# Altium schematic symbol library lib_datalogger.SchLib: 1246 symbols (part 4 of 16) (continued)
## CMP-004-000072-2 (continued)
CAP CER 3000PF 50V NP0 0805; Manufacturer Part Number: GRM2165C1H302JA01D; Temperature Coefficient: C0G, NP0; Lead Spacing: -; Thickness (Max): 0.028" (0.70mm); Package / Case: 0805 (2012 Metric); Size / Dimension: 0.079" L x 0.049" W (2.00mm x 1.25mm); Mounting Type: Surface Mount, MLCC; Lead Style: -; Voltage - Rated: 50V; Part Status: Active; Stock 1: 102721; Applications: General Purpose; Pricing 1: 1=0.25, 10=0.167, 50=0.1016, 100=0.0853, 250=0.06904, 500=0.0609, 1000=0.05177 (USD); ComponentLink1Description: http://www.murata.com/~/media/webrenewal/support/library/catalog/products/capacitor/mlcc/c02e.pdf; Features: -; Source: mits.SchLib; Category: Capacitors; Height - Seated (Max): -; ComponentLink1URL: http://www.murata.com/~/media/webrenewal/support/library/catalog/products/capacitor/mlcc/c02e.pdf; Design Item ID: CAP CER 3000PF 50V NP0 0805 SMD; Operating Temperature: -55°C ~ 125°C; Ratings: -; RoHS: RoHS Compliant
footprint CC1005-0402 (Chip Capacitor; Body 0.039" L x 0.020" W (1.00mm x 0.50mm))
footprint CC2012-0805 (Chip Capacitor)
pins: 1, 2

## CMP-004-000073-2
designator C?, comment CAP CER 4.7nF 50V C0G 0805 SMD_1  Voltage Rating: 50V  Case/Package: 0805  Packaging: Cut Tape  Tolerance: 10%  Max Operating Temperature: 90°C  Manufacturer: KEMET  Capacitance: 4.7nF  Min Operating Temperature: -55°C
Cap Ceramic 0.0047uF 50V X7R 10% Pad SMD 0805 125C Automotive T/R; Manufacturer Part Number: C0805C472K5RECAUTO; Efficiency: 83%; Max Input Voltage: 18V; Min Input Voltage: 9V; Isolation Voltage: 3kV; Number of Outputs: 1; Max Power Dissipation: 6W; Max Output Current: 500mA; Voltage - Output 1: 12V; Mount: Surface Mount; Stock 1: 7793; ComponentLink2URL: https://api.kemet.com/component-edge/download/datasheet/C0805C472K5RECAUTO.pdf?src-supplier=Digi-Key; Pricing 1: 1=0,30000, 10=0,20400, 100=0,11580, 500=0,08172, 1000=0,07151 (USD); Features: UVLO; ComponentLink2Description: https://api.kemet.com/component-edge/download/datasheet/C0805C472K5RECAUTO.pdf?src-supplier=Digi-Key; ComponentLink1Description: https://product.tdk.com/info/en/catalog/datasheets/mlcc_commercial_general_en.pdf; Ratings: AEC-Q200; Source: mits.SchLib; ComponentLink1URL: https://product.tdk.com/info/en/catalog/datasheets/mlcc_commercial_general_en.pdf; Case Code (Metric): 2012; Case Code (Imperial): 0805; Design Item ID: CAP CER 4.7nF 50V C0G 0805 SMD_1
footprint CC1005-0402 (Chip Capacitor; Body 0.039" L x 0.020" W (1.00mm x 0.50mm))
footprint CC2012-0805 (Chip Capacitor)
pins: 1, 2

## CMP-004-000074-2
designator C?, comment CAP CER 4.7uF 100V X7S 1210 SMD  Manufacturer: TDK Corporation  Packaging: Cut Tape (CT)  Capacitance: 4.7µF  Tolerance: ±20%
CAP CER 4.7UF 100V X7S 1210; Manufacturer Part Number: C3225X7S2A475M200AB; Lead Spacing: -; Operating Temperature: -55°C ~ 125°C; Thickness (Max): 0.087" (2.20mm); ComponentLink1Description: https://product.tdk.com/info/en/catalog/datasheets/mlcc_commercial_midvoltage_en.pdf; Pricing 1: 1=1.4, 10=1.148, 100=0.812, 250=0.672, 500=0.602 (USD); Stock 1: 240050; RoHS: RoHS Compliant; Design Item ID: CAP CER 4.7uF 100V X7S 1210 SMD; Ratings: -; Height - Seated (Max): -; Package / Case: 1210 (3225 Metric); Mounting Type: Surface Mount, MLCC; Lead Style: -; Size / Dimension: 0.126" L x 0.098" W (3.20mm x 2.50mm); ComponentLink1URL: https://product.tdk.com/info/en/catalog/datasheets/mlcc_commercial_midvoltage_en.pdf; Source: mits.SchLib; Applications: General Purpose; Temperature Coefficient: X7S; Features: -; Category: Capacitors; Voltage - Rated: 100V
footprint CC1005-0402 (Chip Capacitor; Body 0.039" L x 0.020" W (1.00mm x 0.50mm))
footprint CC3225-1210 (Chip Capacitor; Body 1.6 x 0.8 mm (LxW typ))
pins: 1, 2

## CMP-004-000075-2
designator C?, comment CAP CER 4.7UF 16V X7R 0805  Package Quantity: 1  Case/Package: 0805  Voltage Rating: 16V  Tolerance: 10%  RoHS Compliant: Yes  Packaging: Tape and Reel  Min Operating Temperature: -55°C  Capacitance: 4.7uF  Max Operating Temperature: 125°C
Manufacturer Part Number 1: 0805F475M160NT; Manufacturer 1: FH(Guangdong Fenghua Advanced Tech); Radiation Hardening: No; Thickness: 0.057inch; REACH SVHC: No SVHC; Case Code (Imperial): 0805; Termination: SMD/SMT; Supplier Unit Price 1: 0,0214; Case Code (Metric): 2012; Dielectric: X7R; Ratings: AEC-Q200; Depth: 1.25mm; Length: 2mm; Source: mits.SchLib; Design Item ID: CAP CER 4.7uF 16V 20% Y5V 0805 SMD; Resistor Type: Ceramic; Weight: 0.000194oz; Height: 1.25mm; Voltage Rating (DC): 16V; Width: 0.049inch; Series: CGA; Mount: Surface Mount; Lead Free: Lead Free
footprint CC1005-0402 (Chip Capacitor; Body 0.039" L x 0.020" W (1.00mm x 0.50mm))
footprint CC2012-0805 (Chip Capacitor)
pins: 1, 2

## CMP-004-000076-2
designator C?, comment CAP CER 4.7uF 50V 10% X5R 0805 SMD  Tolerance: 20%  Max Operating Temperature: 85°C  Voltage Rating: 50V  Case/Package: 0805  Capacitance: 4.7uF  Manufacturer: Murata  Packaging: Tape and Reel  Min Operating Temperature: -55°C  RoHS Compliant: Yes
CAP CER 4.7UF 50V X5R 0805; Manufacturer Part Number: GRT21BR61H475ME13L; Case Code (Metric): 2012; Category: Ceramic Capacitors; Source: mits.SchLib; RoHS: Yes; Ratings: AEC-Q200; Case Code (Imperial): 0805; ComponentLink1Description: http://search.murata.co.jp/Ceramy/image/img/A01X/G101/ENG/GRT21BR61H475ME13-01.pdf?src-supplier=Digi-Key; ComponentLink1URL: http://search.murata.co.jp/Ceramy/image/img/A01X/G101/ENG/GRT21BR61H475ME13-01.pdf?src-supplier=Digi-Key; Mount: Surface Mount; Stock 1: 430; Length: 0.079inch; Thickness: 0.057inch; Width: 0.049inch; Pricing 1: 1=0,40000, 10=0,27800, 50=0,19440, 100=0,16660, 500=0,12496, 1000=0,10552 (USD); Design Item ID: CAP CER 4.7uF 50V 10% X5R 0805 SMD
footprint CC1005-0402 (Chip Capacitor; Body 0.039" L x 0.020" W (1.00mm x 0.50mm))
footprint CC2012-0805 (Chip Capacitor)
pins: 1, 2

## CMP-004-000077-2
designator C?, comment CAP CER 4.7uF 50V 10% X7R 1206 SMD  Tolerance: ±10%  Capacitance: 4.7µF  Packaging: Cut Tape (CT)  Manufacturer: Murata Electronics North America
Manufacturer Part Number: GRM31CR71H475KA12L; eVendor#: 490-6521-1-ND; MSRP: 0,30917; eVendorPrice: 0,09; eVendor: Digi-Key; RoHS: RoHS Compliant; Design Item ID: CAP CER 4.7uF 50V 10% X7R 1206 SMD; Size / Dimension: 0.126" L x 0.063" W (3.20mm x 1.60mm); Features: -; Lead Spacing: -; Applications: General Purpose; Lead Style: -; ComponentLink1URL: http://www.murata.com/~/media/webrenewal/support/library/catalog/products/capacitor/mlcc/c02e.pdf; Height - Seated (Max): -; Stock 1: 118827; MOQ: 1000; Pricing 1: 1=0.36, 10=0.296, 50=0.1666, 100=0.148, 250=0.111, 500=0.09806, 1000=0.08695 (USD); Operating Temperature: -55°C ~ 125°C; Part#: GRM31CR71H475KA12L; Package / Case: 1206 (3216 Metric); Ratings: -; Source: mits.SchLib; Category: Capacitors; Datasheet: http://search.murata.co.jp/Ceramy/image/img/A01X/G101/ENG/GRM31CR71H475KA12-01.pdf; Thickness (Max): 0.071" (1.80mm); ComponentLink1Description: http://www.murata.com/~/media/webrenewal/support/library/catalog/products/capacitor/mlcc/c02e.pdf; Mounting Type: Surface Mount, MLCC; Temperature Coefficient: X7R; Voltage - Rated: 50V
footprint CC1005-0402 (Chip Capacitor; Body 0.039" L x 0.020" W (1.00mm x 0.50mm))
footprint CC3216-1206 (Chip Capacitor; Body 3.2 x 1.6 mm (LxW typ))
pins: 1, 2

## CMP-004-000078-2
designator C?, comment CAP CER 4.7uF 6.3V 10% X7R 0603 SMD  Voltage Rating: 6.3V  Case/Package: 0603  Packaging: Tape and Reel  Tolerance: 20%  Max Operating Temperature: 85°C  Manufacturer: Samsung Electro-Mechanics America, Inc  Package Quantity: 1  Min Operating Temperature: -55°C  RoHS Compliant: Yes  Capacitance: 4.7uF
Capacitor: ceramic; MLCC; 4.7uF; 6.3V; X5R; ±10%; SMD; 0603; -55÷85°C; Manufacturer Part Number: CL10A475KQ8NNNC; Part#: CL10B475KQ8NQNC; eVendor: LCSC; eVendorPrice: 0,0076; eVendor#: 1276-2087-1-ND; MSRP: 0,01854; Contact Plating: Tin; Length: 1.6mm; Material: Ceramic; Design Item ID: CAP CER 4.7uF 6.3V 10% X7R 0603 SMD; Height: 0.8mm; Voltage: 6.3V; Datasheet: http://www.samsungsem.com/kr/front/downloadcms.do?path=/kr/support/product-search/mlcc/__icsFiles/afieldfile/2014/11/05&fileName=S_CL10B475KQ8NQNC.pdf; MOQ: 1000; Thickness: 0.035inch; Depth: 0.8mm; Width: 0.031inch; Case Code (Metric): 1608; ComponentLink1URL: https://datasheet.ciiva.com/15195/getdatasheetpartid-358620-15195714.pdf?src-supplier=Verical; ComponentLink2Description: https://datasheet.ciiva.com/29198/457675-da-01-en-vs-kondensator-0603-29198672.pdf?src-supplier=Conrad; Construction: Flat; Pricing 1: 50=0,00760, 500=0,00550, 1500=0,00510, 5000=0,00480, 25000=0,00460, 50000=0,00460, 50=0,00730, 500=0,00530, 1500=0,00490, 5000=0,00470, 25000=0,00440, 50000=0,00440, 50=0,03790, 500=0,02750, 1500=0,02550, 5000=0,02420, 25000=0,02290, 50000=0,02290, 50=0,03660, 500=0,02650, 1500=0,02460, 5000=0,02330, 25000=0,02210, 50000=0,02210, 50=0,00490, 500=0,00360, 1500=0,00330, 5000=0,00310, 25000=0,00300, 50000=0,00300, 50=0,00420, 500=0,00300, 1500=0,00280, 5000=0,00270, 25000=0,00250, 50000=0,00250, 50=0,04510, 500=0,03260, 1500=0,03030, 5000=0,02870, 25000=0,02720, 50000=0,02720, 50=0,63580, 500=0,46040, 1500=0,42750, 5000=0,40560, 25000=0,38360, 50000=0,38360, 50=0,02400, 500=0,01740, 1500=0,01620, 5000=0,01530, 25000=0,01450, 50000=0,01450, 50=0,44090, 500=0,31930, 1500=0,29650, 5000=0,28130, 25000=0,26600, 50000=0,26600, 50=0,05010, 500=0,03630, 1500=0,03370, 5000=0,03200, 25000=0,03020, 50000=0,03020, 50=0,00780, 500=0,00570, 1500=0,00520, 5000=0,00500, 25000=0,00470, 50000=0,00470, 50=0,00580, 500=0,00420, 1500=0,00390, 5000=0,00370, 25000=0,00350, 50000=0,00350 (AUD); ComponentLink3Description: https://datasheet.ciiva.com/16437/cl05b104kq5nnnc-16437321.pdf?src-supplier=Future+Electronics; ComponentLink3URL: https://datasheet.ciiva.com/16437/cl05b104kq5nnnc-16437321.pdf?src-supplier=Future+Electronics; ComponentLink2URL: https://datasheet.ciiva.com/29198/457675-da-01-en-vs-kondensator-0603-29198672.pdf?src-supplier=Conrad; Dielectric: X5R; Radiation Hardening: No; Series: CL; Category: Ceramic Capacitors; Case Code (Imperial): 0603; Mount: Surface Mount; ComponentLink1Description: https://datasheet.ciiva.com/15195/getdatasheetpartid-358620-15195714.pdf?src-supplier=Verical; Source: mits.SchLib; Stock 1: 2545550; RoHS: Yes
footprint CC1005-0402 (Chip Capacitor; Body 0.039" L x 0.020" W (1.00mm x 0.50mm))
footprint CC1608-0603 (Chip Capacitor; Body 1.6 x 0.8 mm (LxW typ))
pins: 1, 2

## CMP-004-000079-2
designator C?, comment CAP CER 4700pF 100V X7R 0603 SMD  Packaging: Cut Tape (CT)  Tolerance: ±10%  Capacitance: 4700pF  Manufacturer: TDK Corporation
CAP CER 4700PF 100V X7R 0603; Manufacturer Part Number: CGA3E2X7R2A472K080AA; Temperature Coefficient: X7R; Package / Case: 0603 (1608 Metric); Size / Dimension: 0.063" L x 0.031" W (1.60mm x 0.80mm); Voltage - Rated: 100V; Source: mits.SchLib; Ratings: AEC-Q200; Height - Seated (Max): -; Features: -; Category: Capacitors; Lead Style: -; Design Item ID: CAP CER 4700pF 100V X7R 0603 SMD; Thickness (Max): 0.035" (0.90mm); Applications: Automotive; RoHS: RoHS Compliant; Part Status: Active; Mounting Type: Surface Mount, MLCC; Lead Spacing: -; ComponentLink1URL: https://product.tdk.com/info/en/catalog/datasheets/mlcc_automotive_midvoltage_en.pdf; ComponentLink1Description: https://product.tdk.com/info/en/catalog/datasheets/mlcc_automotive_midvoltage_en.pdf; Stock 1: 12604; Operating Temperature: -55°C ~ 125°C; Pricing 1: 1=0.1, 10=0.066, 100=0.0303, 250=0.02476, 500=0.02118, 1000=0.0165 (USD)
footprint CC1005-0402 (Chip Capacitor; Body 0.039" L x 0.020" W (1.00mm x 0.50mm))
footprint CC1608-0603 (Chip Capacitor; Body 1.6 x 0.8 mm (LxW typ))
pins: 1, 2

## CMP-004-000080-2
designator C?, comment CAP CER 4700pF 1KV X7R 3216 SMD  Capacitance: 4.7nF  Case/Package: 0805  Packaging: Tape and Reel  Package Quantity: 1  Max Operating Temperature: 125°C  Tolerance: 10%  Min Operating Temperature: -55°C  Manufacturer: Wurth Electronics  Voltage Rating: 1kV
CAP CER 4700pF 1KV  3216 SMD; Manufacturer Part Number: 885342208020; Temperature Coefficient: 30ppm/°C; Dissipation Factor: 2.5%; Dielectric Material: Ceramic; Length: 0.079inch; Height: 1.25mm; ComponentLink9Description: http://www.farnell.com/datasheets/1526458.pdf?src-supplier=Element14; ComponentLink15URL: https://datasheet.ciiva.com/153/aphvc-153206.pdf?src-supplier=Digi-Key; ComponentLink5Description: http://www.mouser.com/ds/2/212/KEM_C1034_X7R_HV_ARC_SMD-1101730.pdf?src-supplier=Mouser; ComponentLink2URL: http://uk.rs-online.com/webdocs/1528/0900766b81528e46.pdf?src-supplier=RSComponents; ComponentLink3Description: http://www.alliedelec.com/images/products/datasheets/bm/KEMET/70395618.pdf?src-supplier=Allied+Electronics; Contact Plating: Tin,Matte; ComponentLink12URL: https://datasheet.ciiva.com/11787/0900766b80ed4c37-11787782.pdf?src-supplier=RSComponents; ComponentLink7URL: http://www.farnell.com/datasheets/2740387.pdf?src-supplier=Newark; Radiation Hardening: No; Category: Ceramic Capacitors; ComponentLink7Description: http://www.farnell.com/datasheets/2740387.pdf?src-supplier=Newark; ComponentLink20URL: https://datasheet.ciiva.com/146/docfinderpartnumber-c1206c472kdractu-146779.pdf?src-supplier=Digi-Key; ComponentLink19Description: https://datasheet.ciiva.com/14594/70001075-14594431.pdf?src-supplier=Allied+Electronics; Stock 2: 6610; ComponentLink8URL: https://api.kemet.com/component-edge/download/datasheet/C0805V472KDRACTU.pdf?src-supplier=Digi-Key; Pricing 2: 1=0,34000, 10=0,23300, 50=0,16320, 100=0,13990, 500=0,10494, 1000=0,08862 (USD); ComponentLink8Description: https://api.kemet.com/component-edge/download/datasheet/C0805V472KDRACTU.pdf?src-supplier=Digi-Key; ComponentLink4Description: http://www.farnell.com/datasheets/2740387.pdf?src-supplier=Farnell; ComponentLink10URL: http://www.farnell.com/datasheets/2120589.pdf?src-supplier=Element14; ComponentLink14Description: https://datasheet.ciiva.com/153/aphvc-153205.pdf?src-supplier=Digi-Key; ComponentLink9URL: http://www.farnell.com/datasheets/1526458.pdf?src-supplier=Element14; Number of Pins: 2; ComponentLink16URL: https://datasheet.ciiva.com/7833/614334-7833527.pdf?src-supplier=Element14; ComponentLink1Description: http://www.farnell.com/datasheets/2547068.pdf?src-supplier=Farnell; Termination: SMD/SMT; ComponentLink20Description: https://datasheet.ciiva.com/146/docfinderpartnumber-c1206c472kdractu-146779.pdf?src-supplier=Digi-Key; ComponentLink5URL: http://www.mouser.com/ds/2/212/KEM_C1034_X7R_HV_ARC_SMD-1101730.pdf?src-supplier=Mouser; ComponentLink11URL: https://datasheet.ciiva.com/19476/1041285-19476096.pdf?src-supplier=Jameco; ComponentLink12Description: https://datasheet.ciiva.com/11787/0900766b80ed4c37-11787782.pdf?src-supplier=RSComponents; ComponentLink14URL: https://datasheet.ciiva.com/153/aphvc-153205.pdf?src-supplier=Digi-Key; Thickness: 0.055inch; ComponentLink18URL: https://datasheet.ciiva.com/11520/aphvc-11520843.pdf?src-supplier=Avnet; Pricing 1: 1=0,48000, 10=0,33000, 50=0,23100, 100=0,19800, 500=0,14850, 1000=0,12540 (USD); ComponentLink10Description: http://www.farnell.com/datasheets/2120589.pdf?src-supplier=Element14; Case Code (Imperial): 0805; ComponentLink1URL: http://www.farnell.com/datasheets/2547068.pdf?src-supplier=Farnell; ComponentLink13Description: https://datasheet.ciiva.com/153/aphvc-153204.pdf?src-supplier=Digi-Key; Depth: 1.25mm; ComponentLink6Description: http://components.arrow.com/part/dataview/0323_04088197?src-supplier=Arrow+Europe; Source: mits.SchLib; Design Item ID: CAP CER 4700pF 1KV X7R 3216 SMD; Voltage: 1kV; REACH SVHC: No SVHC; ComponentLink4URL: http://www.farnell.com/datasheets/2740387.pdf?src-supplier=Farnell; ComponentLink16Description: https://datasheet.ciiva.com/7833/614334-7833527.pdf?src-supplier=Element14; ComponentLink17URL: https://datasheet.ciiva.com/7833/614334-7833528.pdf?src-supplier=Element14; ComponentLink3URL: http://www.alliedelec.com/images/products/datasheets/bm/KEMET/70395618.pdf?src-supplier=Allied+Electronics; ComponentLink15Description: https://datasheet.ciiva.com/153/aphvc-153206.pdf?src-supplier=Digi-Key; Mount: Surface Mount; Dielectric: X7R; Lead Free: Lead Free; Case Code (Metric): 2012; ComponentLink18Description: https://datasheet.ciiva.com/11520/aphvc-11520843.pdf?src-supplier=Avnet; ComponentLink17Description: https://datasheet.ciiva.com/7833/614334-7833528.pdf?src-supplier=Element14; ComponentLink21URL: https://datasheet.ciiva.com/14593/70096142-14593054.pdf?src-supplier=Allied+Electronics; Voltage Rating (DC): 1kV; Stock 1: 561; ComponentLink21Description: https://datasheet.ciiva.com/14593/70096142-14593054.pdf?src-supplier=Allied+Electronics; ComponentLink6URL: http://components.arrow.com/part/dataview/0323_04088197?src-supplier=Arrow+Europe; ComponentLink13URL: https://datasheet.ciiva.com/153/aphvc-153204.pdf?src-supplier=Digi-Key; RoHS: No; ComponentLink2Description: http://uk.rs-online.com/webdocs/1528/0900766b81528e46.pdf?src-supplier=RSComponents; Width: 0.049inch; ComponentLink19URL: https://datasheet.ciiva.com/14594/70001075-14594431.pdf?src-supplier=Allied+Electronics; ComponentLink11Description: https://datasheet.ciiva.com/19476/1041285-19476096.pdf?src-supplier=Jameco
footprint CC1005-0402 (Chip Capacitor; Body 0.039" L x 0.020" W (1.00mm x 0.50mm))
footprint CC3216-1206 (Chip Capacitor; Body 3.2 x 1.6 mm (LxW typ))
pins: 1, 2

## CMP-004-000081-2
designator C?, comment CAP CER 4700pF 1KV X7R 4532 SMD  Package Quantity: 1  Min Operating Temperature: -55°C  Packaging: Tape and Reel  Tolerance: 10%  Manufacturer: Wurth Electronics  Max Operating Temperature: 125°C  Case/Package: 0805  Capacitance: 4.7nF  Voltage Rating: 1kV
Cap Ceramic 0.0047uF 2000V X7R 10% SMD 1812 125C Embossed T/R; Manufacturer Part Number: 885342208020; Temperature Coefficient: 30ppm/°C; Dissipation Factor: 2.5%; ComponentLink27URL: https://datasheet.ciiva.com/6264/partnumbering-e-01-6264492.pdf?src-supplier=Digi-Key; ComponentLink4Description: http://www.farnell.com/datasheets/2740387.pdf?src-supplier=Farnell; ComponentLink5Description: http://www.mouser.com/ds/2/212/KEM_C1034_X7R_HV_ARC_SMD-1101730.pdf?src-supplier=Mouser; ComponentLink13Description: https://datasheet.ciiva.com/153/aphvc-153204.pdf?src-supplier=Digi-Key; ComponentLink19Description: https://datasheet.ciiva.com/14594/70001075-14594431.pdf?src-supplier=Allied+Electronics; Termination: SMD/SMT; ComponentLink4URL: http://www.farnell.com/datasheets/2740387.pdf?src-supplier=Farnell; REACH SVHC: No SVHC; ComponentLink24URL: https://datasheet.ciiva.com/11789/0900766b80ef921d-11789172.pdf?src-supplier=RSComponents; Voltage Rating (DC): 1kV; Thickness: 0.055inch; ComponentLink15URL: https://datasheet.ciiva.com/153/aphvc-153206.pdf?src-supplier=Digi-Key; Mount: Surface Mount; ComponentLink26URL: https://datasheet.ciiva.com/6264/partnumbering-e-01-6264491.pdf?src-supplier=Digi-Key; Contact Plating: Tin,Matte; ComponentLink2Description: http://uk.rs-online.com/webdocs/1528/0900766b81528e46.pdf?src-supplier=RSComponents; ComponentLink17URL: https://datasheet.ciiva.com/7833/614334-7833528.pdf?src-supplier=Element14; Number of Pins: 2; RoHS: No; ComponentLink26Description: https://datasheet.ciiva.com/6264/partnumbering-e-01-6264491.pdf?src-supplier=Digi-Key; Length: 0.079inch; ComponentLink9Description: http://www.farnell.com/datasheets/1526458.pdf?src-supplier=Element14; ComponentLink28URL: https://datasheet.ciiva.com/6264/partnumbering-e-01-6264493.pdf?src-supplier=Digi-Key; Category: Ceramic Capacitors; Dielectric Material: Ceramic; Lead Free: Lead Free; ComponentLink13URL: https://datasheet.ciiva.com/153/aphvc-153204.pdf?src-supplier=Digi-Key; ComponentLink1URL: http://www.farnell.com/datasheets/2547068.pdf?src-supplier=Farnell; ComponentLink1Description: http://www.farnell.com/datasheets/2547068.pdf?src-supplier=Farnell; Dielectric: X7R; Depth: 1.25mm; ComponentLink2URL: http://uk.rs-online.com/webdocs/1528/0900766b81528e46.pdf?src-supplier=RSComponents; ComponentLink10Description: http://www.farnell.com/datasheets/2120589.pdf?src-supplier=Element14; ComponentLink22Description: https://datasheet.ciiva.com/18183/getdatasheetpartid-199959-18183895.pdf?src-supplier=Verical; ComponentLink23Description: https://datasheet.ciiva.com/16497/product-16497101.pdf?src-supplier=Future+Electronics; Radiation Hardening: No; ComponentLink27Description: https://datasheet.ciiva.com/6264/partnumbering-e-01-6264492.pdf?src-supplier=Digi-Key; ComponentLink8URL: https://api.kemet.com/component-edge/download/datasheet/C0805V472KDRACTU.pdf?src-supplier=Digi-Key; Source: mits.SchLib; ComponentLink6Description: http://components.arrow.com/part/dataview/0323_04088197?src-supplier=Arrow+Europe; ComponentLink7Description: http://www.farnell.com/datasheets/2740387.pdf?src-supplier=Newark; Stock 2: 44688; ComponentLink11URL: https://datasheet.ciiva.com/19476/1041285-19476096.pdf?src-supplier=Jameco; ComponentLink5URL: http://www.mouser.com/ds/2/212/KEM_C1034_X7R_HV_ARC_SMD-1101730.pdf?src-supplier=Mouser; ComponentLink18Description: https://datasheet.ciiva.com/11520/aphvc-11520843.pdf?src-supplier=Avnet; Stock 1: 561; ComponentLink15Description: https://datasheet.ciiva.com/153/aphvc-153206.pdf?src-supplier=Digi-Key; ComponentLink17Description: https://datasheet.ciiva.com/7833/614334-7833528.pdf?src-supplier=Element14; ComponentLink19URL: https://datasheet.ciiva.com/14594/70001075-14594431.pdf?src-supplier=Allied+Electronics; ComponentLink6URL: http://components.arrow.com/part/dataview/0323_04088197?src-supplier=Arrow+Europe; ComponentLink21Description: https://datasheet.ciiva.com/14593/70096142-14593054.pdf?src-supplier=Allied+Electronics; ComponentLink23URL: https://datasheet.ciiva.com/16497/product-16497101.pdf?src-supplier=Future+Electronics; Case Code (Metric): 2012; Pricing 1: 1=0,48000, 10=0,33000, 50=0,23100, 100=0,19800, 500=0,14850, 1000=0,12540 (USD); ComponentLink18URL: https://datasheet.ciiva.com/11520/aphvc-11520843.pdf?src-supplier=Avnet; ComponentLink12Description: https://datasheet.ciiva.com/11787/0900766b80ed4c37-11787782.pdf?src-supplier=RSComponents; Width: 0.049inch; ComponentLink3URL: http://www.alliedelec.com/images/products/datasheets/bm/KEMET/70395618.pdf?src-supplier=Allied+Electronics; ComponentLink20Description: https://datasheet.ciiva.com/146/docfinderpartnumber-c1206c472kdractu-146779.pdf?src-supplier=Digi-Key; ComponentLink25Description: https://datasheet.ciiva.com/5420/c02e-5420457.pdf?src-supplier=Mouser; ComponentLink21URL: https://datasheet.ciiva.com/14593/70096142-14593054.pdf?src-supplier=Allied+Electronics; ComponentLink8Description: https://api.kemet.com/component-edge/download/datasheet/C0805V472KDRACTU.pdf?src-supplier=Digi-Key; Height: 1.25mm; ComponentLink24Description: https://datasheet.ciiva.com/11789/0900766b80ef921d-11789172.pdf?src-supplier=RSComponents; Case Code (Imperial): 0805; ComponentLink28Description: https://datasheet.ciiva.com/6264/partnumbering-e-01-6264493.pdf?src-supplier=Digi-Key; ComponentLink10URL: http://www.farnell.com/datasheets/2120589.pdf?src-supplier=Element14; ComponentLink20URL: https://datasheet.ciiva.com/146/docfinderpartnumber-c1206c472kdractu-146779.pdf?src-supplier=Digi-Key; Design Item ID: CAP CER 4700pF 1KV X7R 4532 SMD; ComponentLink9URL: http://www.farnell.com/datasheets/1526458.pdf?src-supplier=Element14; Voltage: 1kV; ComponentLink22URL: https://datasheet.ciiva.com/18183/getdatasheetpartid-199959-18183895.pdf?src-supplier=Verical; ComponentLink7URL: http://www.farnell.com/datasheets/2740387.pdf?src-supplier=Newark; ComponentLink11Description: https://datasheet.ciiva.com/19476/1041285-19476096.pdf?src-supplier=Jameco; ComponentLink14URL: https://datasheet.ciiva.com/153/aphvc-153205.pdf?src-supplier=Digi-Key; ComponentLink16URL: https://datasheet.ciiva.com/7833/614334-7833527.pdf?src-supplier=Element14; ComponentLink14Description: https://datasheet.ciiva.com/153/aphvc-153205.pdf?src-supplier=Digi-Key; ComponentLink3Description: http://www.alliedelec.com/images/products/datasheets/bm/KEMET/70395618.pdf?src-supplier=Allied+Electronics; Pricing 2: 1=1,79000, 10=1,45100, 50=1,26640, 100=1,10820, 500=0,84432 (USD); ComponentLink12URL: https://datasheet.ciiva.com/11787/0900766b80ed4c37-11787782.pdf?src-supplier=RSComponents; ComponentLink16Description: https://datasheet.ciiva.com/7833/614334-7833527.pdf?src-supplier=Element14; ComponentLink25URL: https://datasheet.ciiva.com/5420/c02e-5420457.pdf?src-supplier=Mouser
footprint CC1005-0402 (Chip Capacitor; Body 0.039" L x 0.020" W (1.00mm x 0.50mm))
footprint CC4532-1812 (Chip Capacitor)
pins: 1, 2

## CMP-004-000082-2
designator C?, comment CAP CER 4700pF 2KV X7R 3225 SMD  Max Operating Temperature: 125°C  Package Quantity: 1  Packaging: Tape and Reel  Case/Package: 1210  Capacitance: 4.7nF  Voltage Rating: 2kV  Min Operating Temperature: -55°C  Manufacturer: KEMET  Tolerance: 10%
CAP CER 4700PF 2KV 10% X7R 1210; Manufacturer Part Number: C1210C472KGRACTU; Voltage Rating (DC): 2.5kV; Dielectric Material: Ceramic; Dissipation Factor: 2.5%; ComponentLink4Description: http://www.farnell.com/datasheets/2746122.pdf?src-supplier=Newark; ComponentLink5URL: https://api.kemet.com/component-edge/download/datasheet/C1210C472KGRACTU.pdf?src-supplier=Digi-Key; Mount: Surface Mount; ComponentLink2URL: http://www.farnell.com/datasheets/2600185.pdf?src-supplier=Farnell; ComponentLink1Description: http://components.arrow.com/part/dataview/0323_00352574?src-supplier=Arrow+Europe; ComponentLink3URL: http://www.mouser.com/ds/2/212/KEM_C1010_X7R_HV_SMD-1102742.pdf?src-supplier=Mouser; ComponentLink8Description: http://www.farnell.com/datasheets/2065015.pdf?src-supplier=Element14; Length: 3.2mm; Case Code (Imperial): 1210; Depth: 2.5mm; Thickness: 0.091inch; ComponentLink6URL: http://components.arrow.com/part/dataview/48187685S8617565N7429?src-supplier=Arrow; Termination: SMD/SMT; Stock 1: 35446; ComponentLink6Description: http://components.arrow.com/part/dataview/48187685S8617565N7429?src-supplier=Arrow; ComponentLink1URL: http://components.arrow.com/part/dataview/0323_00352574?src-supplier=Arrow+Europe; ComponentLink4URL: http://www.farnell.com/datasheets/2746122.pdf?src-supplier=Newark; RoHS: Yes; Source: mits.SchLib; Design Item ID: CAP CER 4700pF 2KV X7R 3225 SMD; ComponentLink2Description: http://www.farnell.com/datasheets/2600185.pdf?src-supplier=Farnell; ComponentLink8URL: http://www.farnell.com/datasheets/2065015.pdf?src-supplier=Element14; Category: Ceramic Capacitors; ComponentLink3Description: http://www.mouser.com/ds/2/212/KEM_C1010_X7R_HV_SMD-1102742.pdf?src-supplier=Mouser; Case Code (Metric): 3225; Width: 2.5mm; REACH SVHC: No SVHC; Dielectric: X7R; ComponentLink5Description: https://api.kemet.com/component-edge/download/datasheet/C1210C472KGRACTU.pdf?src-supplier=Digi-Key; Pricing 1: 1=1,19000, 10=0,94300, 100=0,70700, 500=0,53418, 1000=0,47134 (USD); ComponentLink7Description: http://capacitoredge.kemet.com/capedge2/DataSheet?pn=C1210C472KGRACTU&src-supplier=Avnet; ComponentLink7URL: http://capacitoredge.kemet.com/capedge2/DataSheet?pn=C1210C472KGRACTU&src-supplier=Avnet; Height: 2.1mm
footprint CC1005-0402 (Chip Capacitor; Body 0.039" L x 0.020" W (1.00mm x 0.50mm))
footprint CC3225-1210 (Chip Capacitor; Body 1.6 x 0.8 mm (LxW typ))
pins: 1, 2

## CMP-004-000083-2
designator C?, comment CAP CER 470nF 450V X7T 1812 SMD  Min Operating Temperature: -25°C  Tolerance: 10%  Voltage Rating: 450V  Case/Package: 1812  Capacitance: 470nF  Packaging: Tape and Reel  Package Quantity: 1  Max Operating Temperature: 85°C
470NF ±10% 450V X7T 1812 MULTILAYER CERAMIC CAPACITORS MLCC - SMD/SMT ROHS; Manufacturer 1: TDK; Manufacturer Part Number 1: CGA8N4X7T2W474K230KA; Case Code (Metric): 1812; Dielectric: X7T; Mount: Surface Mount; Dielectric Material: Ceramic; Category: Ceramic Capacitors; Source: mits.SchLib; Case Code (Imperial): 4532; Design Item ID: CAP CER 470nF 450V X7T 1812 SMD; Number of Pins: 2; Voltage: 450V; Termination: SMD/SMT
footprint CC1005-0402 (Chip Capacitor; Body 0.039" L x 0.020" W (1.00mm x 0.50mm))
footprint CC4532-1812 (Chip Capacitor)
pins: 1, 2

## CMP-004-000084-2
designator C?, comment CAP CER 6.8pF 50V 0.5% COG 0402 SMD
6.8pF ±0.5pF 50V C0G 0402 Multilayer Ceramic Capacitors MLCC - SMD/SMT RoHS; Manufacturer Part Number 1: CGA2B2C0G1H6R8DT0Y0F; Manufacturer 1: TDK; Design Item ID: CAP CER 6.8pF 50V 0.5% COG 0402 SMD; Stock 1: 3350; RoHS: No; Pricing 1: 50=0,01940, 500=0,01490, 1500=0,01410, 5000=0,01330, 25000=0,01310, 50000=0,01280, 50=0,01860, 500=0,01430, 1500=0,01360, 5000=0,01280, 25000=0,01260, 50000=0,01230, 50=0,09690, 500=0,07470, 1500=0,07070, 5000=0,06680, 25000=0,06550, 50000=0,06420, 50=0,09240, 500=0,07120, 1500=0,06750, 5000=0,06370, 25000=0,06250, 50000=0,06120, 50=0,01240, 500=0,00960, 1500=0,00910, 5000=0,00860, 25000=0,00840, 50000=0,00820, 50=0,01080, 500=0,00830, 1500=0,00790, 5000=0,00740, 25000=0,00730, 50000=0,00710, 50=0,11510, 500=0,08870, 1500=0,08400, 5000=0,07930, 25000=0,07780, 50000=0,07620, 50=1,61730, 500=1,24570, 1500=1,18020, 5000=1,11460, 25000=1,09270, 50000=1,07090, 50=0,06120, 500=0,04720, 1500=0,04470, 5000=0,04220, 25000=0,04140, 50000=0,04050, 50=1,13860, 500=0,87700, 1500=0,83090, 5000=0,78470, 25000=0,76930, 50000=0,75390, 50=0,12650, 500=0,09740, 1500=0,09230, 5000=0,08720, 25000=0,08550, 50000=0,08380, 50=0,01980, 500=0,01530, 1500=0,01450, 5000=0,01370, 25000=0,01340, 50000=0,01310, 50=0,01480, 500=0,01140, 1500=0,01080, 5000=0,01020, 25000=0,01000, 50000=0,00980 (AUD); Source: mits.SchLib
footprint CC1005-0402 (Chip Capacitor; Body 0.039" L x 0.020" W (1.00mm x 0.50mm))
footprint CC1005-0402-3 (Chip Capacitor; Body 0.039" L x 0.020" W (1.00mm x 0.50mm))
pins: 1, 2

## CMP-004-000085-2
designator C?, comment CAP CER 8.2pF 50V 0.25% COG 0402 SMD  Min Operating Temperature: -55°C  Capacitance: 8.2pF  Case/Package: 0402  Packaging: Tape and Reel  Max Operating Temperature: 125°C  Manufacturer: Murata  Package Quantity: 10000  Voltage Rating: 50V
MURATA - GRM1555C1H8R2CA01D - SMD Multilayer Ceramic Capacitor, 8.2 pF, 50 V, 0402 [1005 Metric], ± 0.25pF, C0G / NP0, GRM Series; Temperature Coefficient: 30ppm/°C; Source: mits.SchLib; ComponentLink1Description: https://datasheet.ciiva.com/6263/grm1555c1h8r2ca01-01-6263749.pdf?src-supplier=Digi-Key; Design Item ID: CAP CER 8.2pF 50V 0.25% COG 0402 SMD; ComponentLink7URL: https://datasheet.ciiva.com/7828/608985-7828885.pdf?src-supplier=Element14; ComponentLink2URL: https://datasheet.ciiva.com/11789/0900766b80ef921d-11789224.pdf?src-supplier=RSComponents; ComponentLink8URL: https://datasheet.ciiva.com/22698/608985-22698405.pdf?src-supplier=Element14; Depth: 0.5mm; Length: 1mm; ComponentLink5Description: https://datasheet.ciiva.com/6263/partnumbering-e-01-6263751.pdf?src-supplier=Digi-Key; Mount: Surface Mount; Case Code (Imperial): 0402; Construction: Flat; Voltage Rating (DC): 50V; Dielectric: C0G; Stock 1: 8400; ComponentLink6Description: https://datasheet.ciiva.com/11610/product-11610074.pdf?src-supplier=Avnet; Category: Ceramic Capacitors; Height: 0.5mm; ComponentLink6URL: https://datasheet.ciiva.com/11610/product-11610074.pdf?src-supplier=Avnet; ComponentLink4Description: https://datasheet.ciiva.com/6263/partnumbering-e-01-6263750.pdf?src-supplier=Digi-Key; ComponentLink4URL: https://datasheet.ciiva.com/6263/partnumbering-e-01-6263750.pdf?src-supplier=Digi-Key; ComponentLink1URL: https://datasheet.ciiva.com/6263/grm1555c1h8r2ca01-01-6263749.pdf?src-supplier=Digi-Key; Pricing 1: 50=0,00470, 500=0,00350, 1500=0,00330, 5000=0,00310, 25000=0,00300, 50000=0,00290, 50=0,00450, 500=0,00340, 1500=0,00310, 5000=0,00300, 25000=0,00290, 50000=0,00280, 50=0,02360, 500=0,01770, 1500=0,01640, 5000=0,01570, 25000=0,01510, 50000=0,01440, 50=0,02250, 500=0,01690, 1500=0,01560, 5000=0,01500, 25000=0,01440, 50000=0,01370, 50=0,00300, 500=0,00230, 1500=0,00210, 5000=0,00200, 25000=0,00190, 50000=0,00180, 50=0,00260, 500=0,00200, 1500=0,00180, 5000=0,00170, 25000=0,00170, 50000=0,00160, 50=0,02800, 500=0,02100, 1500=0,01940, 5000=0,01870, 25000=0,01790, 50000=0,01710, 50=0,39340, 500=0,29500, 1500=0,27320, 5000=0,26230, 25000=0,25130, 50000=0,24040, 50=0,01490, 500=0,01120, 1500=0,01030, 5000=0,00990, 25000=0,00950, 50000=0,00910, 50=0,27700, 500=0,20770, 1500=0,19230, 5000=0,18460, 25000=0,17690, 50000=0,16930, 50=0,03080, 500=0,02310, 1500=0,02140, 5000=0,02050, 25000=0,01970, 50000=0,01880, 50=0,00480, 500=0,00360, 1500=0,00330, 5000=0,00320, 25000=0,00310, 50000=0,00290, 50=0,00360, 500=0,00270, 1500=0,00250, 5000=0,00240, 25000=0,00230, 50000=0,00220 (AUD); Series: GRM; Case Code (Metric): 1005; ComponentLink8Description: https://datasheet.ciiva.com/22698/608985-22698405.pdf?src-supplier=Element14; Voltage: 50V; Radiation Hardening: No; Termination: SMD/SMT; RoHS: Yes; Number of Pins: 2; ComponentLink7Description: https://datasheet.ciiva.com/7828/608985-7828885.pdf?src-supplier=Element14; Width: 0.5mm; Thickness: 0.022inch; ComponentLink2Description: https://datasheet.ciiva.com/11789/0900766b80ef921d-11789224.pdf?src-supplier=RSComponents; Lead Free: Lead Free; ComponentLink3URL: https://datasheet.ciiva.com/18184/getdatasheetpartid-387783-18184512.pdf?src-supplier=Verical; REACH SVHC: No SVHC; ComponentLink5URL: https://datasheet.ciiva.com/6263/partnumbering-e-01-6263751.pdf?src-supplier=Digi-Key; Manufacturer Part Number: GRM1555C1H8R2CA01D; Material: Ceramic; ComponentLink3Description: https://datasheet.ciiva.com/18184/getdatasheetpartid-387783-18184512.pdf?src-supplier=Verical
footprint CC1005-0402 (Chip Capacitor; Body 0.039" L x 0.020" W (1.00mm x 0.50mm))
footprint CC1005-0402-3 (Chip Capacitor; Body 0.039" L x 0.020" W (1.00mm x 0.50mm))
pins: 1, 2

## CMP-004-000086-1
designator LC?, comment CAP FEEDTHRU 0.022UF 50V 0805 SMD  Manufacturer: Knowles Syfer  Tolerance: ±20%  Capacitance: 0.022µF  Packaging: Cut Tape (CT)
CAP FEEDTHRU 0.022UF 50V 0805; Manufacturer Part Number: 0805J0500223MXTE01; Temperature Coefficient: X7R; Current: 300mA; Insertion Loss: 43dB @ 100MHz; Source: mits.SchLib; Pricing 1: 1=0.64, 10=0.614, 25=0.594, 50=0.4852, 100=0.4356, 250=0.396, 500=0.3762, 1000=0.3366 (USD); Voltage - Rated: 50V; ComponentLink1Description: http://www.knowlescapacitors.com/File%20Library/Syfer/English/Product%20Navigation/Product%20Family%20Datasheet/E01E07Datasheet.pdf; Height (Max): 0.045" (1.15mm); Mounting Type: Surface Mount; Design Item ID: CAP FEEDTHRU 0.022UF 50V 0805 SMD; Thread Size: -; Category: Filters; Part Status: Active; RoHS: RoHS Compliant; DC Resistance (DCR) (Max): -; Size / Dimension: 0.079" L x 0.049" W (2.00mm x 1.25mm); Ratings: -; Operating Temperature: -55°C ~ 125°C; Package / Case: 0805 (2012 Metric); Stock 1: 5530; ComponentLink1URL: http://www.knowlescapacitors.com/File%20Library/Syfer/English/Product%20Navigation/Product%20Family%20Datasheet/E01E07Datasheet.pdf
footprint CC_FT_0805
footprint CC_FT_0805
pins: 1 Input, 2 GND, 3 Output

## CMP-004-000088-1
designator C?, comment CAP TANT 4.7uF 16V 10% 0805 SMD  Max Operating Temperature: 125°C  Tolerance: 10%  Capacitance: 4.7uF  Voltage Rating: 16V  Min Operating Temperature: -55°C  Package Quantity: 1  Case/Package: 0805  Packaging: Tape and Reel  Manufacturer: Kyocera AVX
CAP TANT 4.7UF 16V 10% 0805; Manufacturer Part Number: TAJP475K016RNJ; ESR (Equivalent Series Resistance): 5R; Dissipation Factor: 8%; Dielectric Material: Tantalum; Leakage Current: 800nA; Polarity: Polar; ComponentLink4Description: https://datasheet.ciiva.com/6246/tajlp-6246941.pdf?src-supplier=Digi-Key; REACH SVHC: No SVHC; ComponentLink1Description: https://datasheet.ciiva.com/7914/tajlp-7914636.pdf?src-supplier=Element14; Height: 1.5mm; Mount: Surface Mount; Pricing 1: 1=1,00000, 10=0,76200, 100=0,54540, 500=0,42228, 1000=0,36363 (USD); Termination: SMD/SMT; ComponentLink5Description: https://datasheet.ciiva.com/11301/tajlp-11301135.pdf?src-supplier=Avnet; ComponentLink4URL: https://datasheet.ciiva.com/6246/tajlp-6246941.pdf?src-supplier=Digi-Key; ComponentLink3Description: https://datasheet.ciiva.com/7914/tajlp-7914635.pdf?src-supplier=Element14; Stock 1: 4297; ComponentLink2URL: https://datasheet.ciiva.com/6246/tajlp-6246942.pdf?src-supplier=Digi-Key; ComponentLink1URL: https://datasheet.ciiva.com/7914/tajlp-7914636.pdf?src-supplier=Element14; Design Item ID: CAP TANT 4.7uF 16V 10% 0805 SMD; Lead Free: Lead Free; Length: 2.05mm; Height - Seated (Max): 0.059inch; Radiation Hardening: No; Category: Tantalum Capacitors; Width: 0.051inch; ComponentLink5URL: https://datasheet.ciiva.com/11301/tajlp-11301135.pdf?src-supplier=Avnet; Case Code (Imperial): 0805; Case Code (Metric): 2012; Features: General Purpose; Source: mits.SchLib; ComponentLink2Description: https://datasheet.ciiva.com/6246/tajlp-6246942.pdf?src-supplier=Digi-Key; RoHS: Yes; Depth: 1.35mm; ComponentLink3URL: https://datasheet.ciiva.com/7914/tajlp-7914635.pdf?src-supplier=Element14
footprint CAP TANT CASE R 0805 (0.081" L x 0.051" W (2.05mm x 1.30mm))
footprint CAP TANT CASE R 0805 (0.081" L x 0.051" W (2.05mm x 1.30mm))
pins: 1, 2

## CMP-005-000000-1
designator CON?, comment CONN JTAG
Source: mits.SchLib; Design Item ID: CONN JTAG
footprint JTAG
footprint JTAG
pins: 1, 2, 3, 4, 5

## CMP-005-00000-3
designator F?, comment MF-MSMF050
PTC Resettable Fuse, 15 V, 500 mA, -40 to 85 degC, 2-Pin SMD, RoHS, Tape and Reel; Manufacturer: Bourns; Current Rating: 100A; Case/Package: MF-MSMF050-2; Package Reference: MF-MSMF050-2; Package Description: 2-Pin Surface Mount Device, Body 4.55 x 3.24 mm; Mounting Technology: SM; Datasheet Version: Rev. AG, 08/2016; Min Operating Temperature: -40°C; Max Operating Temperature: 85°C; RoHS Compliant: False; Packaging: TapeandReel; Datasheet URL: http://www.bourns.com/data/global/pdfs/mfmsmf.pdf
footprint LFUS-466_V (SMD, 2-Leads, Body 3.175x1.524mm)
footprint BOUR-MF-MSMF050-2_V (SMD, 2-Leads, Body 4.55x3.24mm)
pins: 1, 2

## CMP-005-000001-1
designator CON?, comment CONN UART
Source: mits.SchLib; Design Item ID: CONN UART
footprint JUART
footprint JUART
pins: 1, 2, 3